# Altium integrated library Library AL.IntLib: 511 symbols (part 2 of 4) (continued)
## L298 (continued)

## L fiter
designator L?, comment L
Inductor; Value: Loc 220; Designed by: VanDungEvn
footprint L fiter (Fiter)
pins: 1, 2, 3, 4

## LCD16x2
designator LCD?, comment LCD16x2A
LCD dipslay 16 char, 2 line; Value: LCD16x2A
footprint LCD16X2N (LCD dipslay 16x2, 16 pin)
footprint LCD16X2 (LCD dipslay 16x2, 16 pin)
pins: 1 GND, 2 VDD, 3 VSS, 4 RS, 5 R/~{W}, 6 ~{EN}, 7 D0, 8 D1, 9 D2, 10 D3, 11 D4, 12 D5, 13 D6, 14 D7, 15 A, 16 K
text: LCD 16*2; -; +

## LCD16x2A
designator LCD?, comment LCD 16x2A
LCD dipslay 16 char, 2 line; Value: LCD16x2A
footprint LCD16X2 (LCD dipslay 16x2, 16 pin)
footprint LCD16X2N (LCD dipslay 16x2, 16 pin)
pins: 1 GND, 2 VDD, 3 VEE, 4 RS, 5 R/~{W}, 6 ~{EN}, 7 D0, 8 D1, 9 D2, 10 D3, 11 D4, 12 D5, 13 D6, 14 D7, 15 A, 16 K
text: 5V; LCD 16*2; Vs; |; 0V; R/W; E

## LCD20x4A
designator LCD, comment LCD 20x4A
LCD dipslay 20 char, 4 line; Value: Jum 40; Value: LCD 20x4A
footprint LCD 20x4A (Footprint not found)
pins: 1 GND, 2 VDD, 3 VSS, 4 RS, 5 R/~{W}, 6 ~{EN}, 7 D0, 8 D1, 9 D2, 10 D3, 11 D4, 12 D5, 13 D6, 14 D7, 15 A, 16 K

## LCD48x84
designator U?, comment PCD8544
LCD Graphic; Value: PCD8544
footprint DIP10 (Footprint not found)
pins: 1 VCC, 2 SCLK, 3 SI, 4 D/C, 5 CS, 6 OSC, 7 GND, 8 Vout, 9 ~{RES}

## LCD128x64
designator LCD?
LCD Graphic 128x64; Value: LCD 128x64
footprint LCD128x64 (LCD Graphic 128x64, 20 pin)
footprint LCD12864 (GLCD)
pins: 1 GND, 2 VDD, 3 VSS, 4 RS, 5 R/~{W}, 6 ~{EN}, 7 D0, 8 D1, 9 D2, 10 D3, 11 D4, 12 D5, 13 D6, 14 D7, 15 S1, 16 S2, 17 ~{RES}, 18 VEE, 19 A, 20 K
text: GLCD 128*64; heromap

## LCD240X128
designator U?
Mµn h×nh LCD 240x128
footprint LCD
pins: 1 FGND, 2 VSS, 3 VDD, 4 V0, 5 ~{WR} (in), 6 ~{RD} (in), 7 ~{CS} (in), 8 C/D (in), 9 ~{RST} (in), 10 DB0 (io), 11 DB1 (io), 12 DB2 (io), 13 DB3 (io), 14 DB4 (io), 15 DB5 (io), 16 DB6 (io), 17 DB7 (io), 18 FS, 19 VEE, 20 LED+, 21 LED-

## LCD240X128_1
designator U?, comment LCD240X128
Mµn h×nh LCD 240x128
footprint LCD
pins: 1 FGND, 2 VSS, 3 VDD, 4 V0, 5 ~{WR} (in), 6 ~{RD} (in), 7 ~{CS} (in), 8 C/D (in), 9 ~{RST} (in), 10 DB0 (io), 11 DB1 (io), 12 DB2 (io), 13 DB3 (io), 14 DB4 (io), 15 DB5 (io), 16 DB6 (io), 17 DB7 (io), 18 FS, 19 VEE, 20 LED+, 21 LED-

## LDR
designator LDR?
Quang Tro
footprint CDS (Footprint not found)
pins: 1 A, 2 K

## LED
designator LED?
LED Single colour Green and Red; Value: LED 3 ly Single Colour
footprint LED-3 (LED 2 PIN, 3ly Only colour)
footprint LED-V (LED 2 PIN, Rectang Only colour)
footprint LED-O (LED 2 PIN,  Ovan Only colour, pin to pin 110mil)
footprint LED-5 GRe (LED 2 PIN, 5 ly , Only colour,pin to pin 100mil)
footprint LED-5TRED (LED 2 PIN, 5 ly , Only colour, pin to pin 110mil)
footprint L-0805 (Compoment SMD 80x50mil)
pins: 1, 2

## LED2
designator LED?, comment LED
LED 2 colour Green and Red; Value: LED 3 - 5 ly 2 Colour
footprint LED-32 (LED 3 PIN, 3ly Two colour)
footprint LED-52 (LED 3 PIN, 5 ly , Two colour)
pins: 1, 2, 3

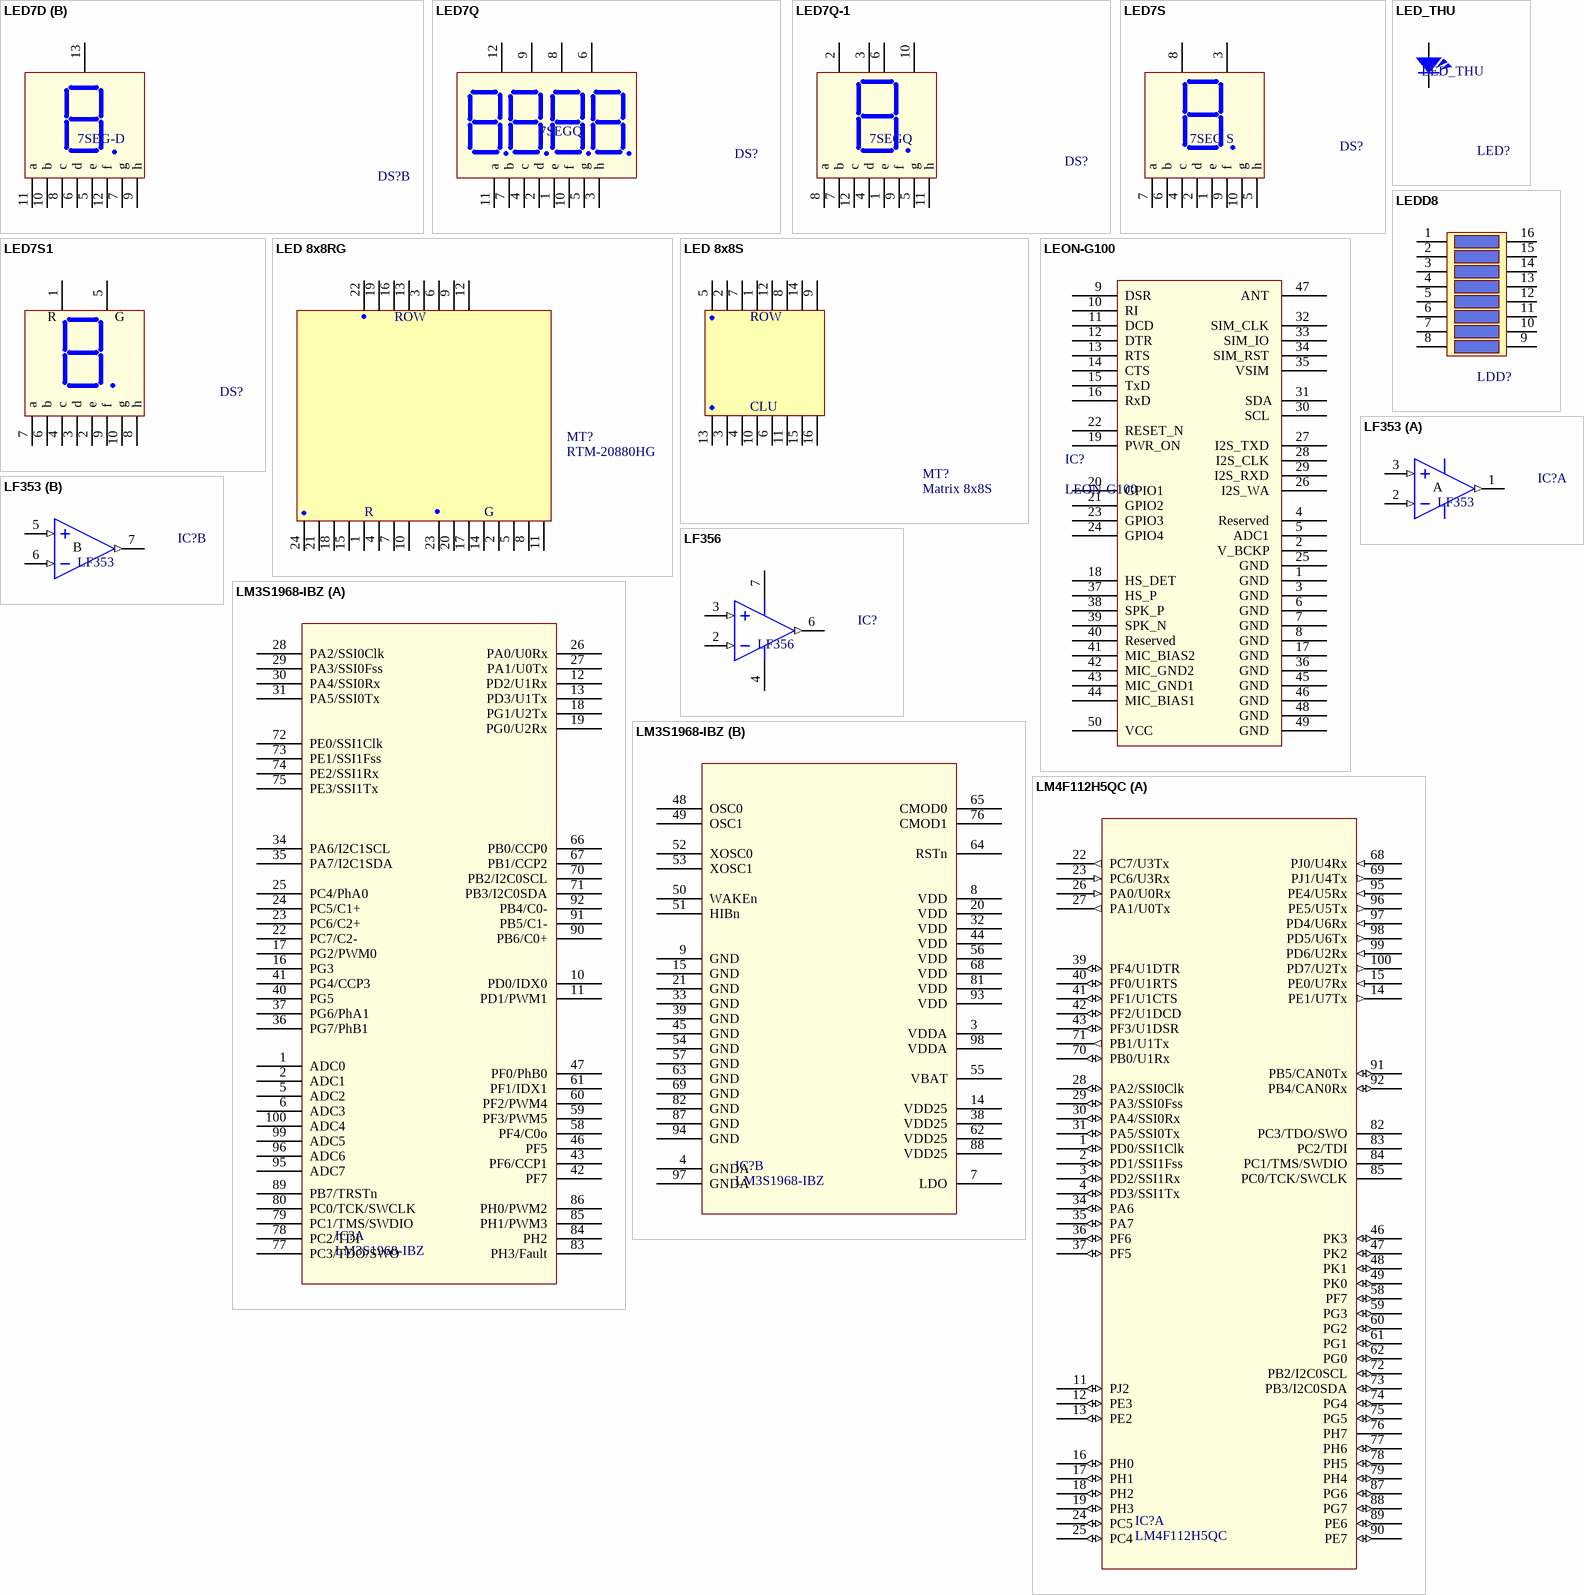
[diagram p12: symbols LED7D to LM4F112H5QC]

## LED7D
designator DS?, comment 7SEG-D
Two 7 Seg Dipslay; Value: LED 7D SEG
footprint 7SEGD (DIP 18Leads; Body 24 x 15 mm; Pitch 0.5 mm)
part A pins: 1 e, 2 d, 3 c, 4 h, 14 V1, 15 b, 16 a, 17 g, 18 f
part B pins: 5 e, 6 d, 7 g, 8 c, 9 h, 10 b, 11 a, 12 f, 13 V2

## LED7Q
designator DS?, comment 7SEGQ
Four 7 Seg Dipslay; Value: LED 7Q SEG
footprint 7SEGQ (DIP 12 Leads; Body 48 x 20 mm; Pitch 0.5 mm)
footprint 7SEGQ-N (DIP 12 Leads; Body 32x 15 mm; Pitch 0.5 mm)
pins: 1 e, 2 d, 3 h, 4 c, 5 g, 6 V4, 7 b, 8 V3, 9 V2, 10 f, 11 a, 12 V1

## LED7Q-1
designator DS?, comment 7SEGQ
Four 7 Seg Dipslay; Value: LED 7Q SEG
footprint 7SEGQ (DIP 12 Leads; Body 48 x 20 mm; Pitch 0.5 mm)
pins: 1 e, 2 V1, 3 V2, 4 d, 5 g, 6 V3, 7 b, 8 a, 9 f, 10 V4, 11 h, 12 c

## LED7S
designator DS?, comment 7SEG S
Single 7 Seg Dipslay; Value: LED 7S SEG
footprint 7SEGS (DIP 10 Leads; Body 12 x 15 mm; Pitch 0.5 mm)
pins: 1 e, 2 d, 3 Vcc, 4 c, 5 h, 6 b, 7 a, 8 Vcc, 9 f, 10 g

## LED7S1
designator DS?, comment 7SEG S  (value not drawn)
Single 7 Seg Dipslay 29x41 mm; Value: LED 7S SEG
footprint 7SEG_29x41 (DIP 10 Leads; Body 29 x 41 mm; Pitch 0.5 mm)
footprint 7SEG_37x55 (DIP 10 Leads; Body 29 x 41 mm; Pitch 0.5 mm)
pins: 1 R, 2 e, 3 d, 4 c, 5 COM, 6 b, 7 a, 8 h, 9 f, 10 g
text: G

## LED 8x8RG
designator MT?, comment RTM-20880HG
Matrix 8x8, Two colour; Value: Matrix 8x8 two colour
footprint 8x8RG (Matran 8x8 2mau,Body 60 X 60mm)
pins: 1 R5, 2 G5, 3 H5, 4 R6, 5 G6, 6 H6, 7 R7, 8 G7, 9 H7, 10 R8, 11 G8, 12 H8, 13 H4, 14 G4, 15 R4, 16 H3, 17 G3, 18 R3, 19 H2, 20 G2, 21 R2, 22 H1, 23 G1, 24 R1
text: ROW; R; G

## LED 8x8S
designator MT?, comment Matrix 8x8S
Matrix 8x8,  Single colour; Value: Matrix 8x8S
footprint 8x8S (Matran 8x8, Body 60 X 60mm)
pins: 1 H4, 2 H2, 3 C2, 4 C3, 5 H1, 6 C5, 7 H3, 8 H6, 9 H8, 10 C4, 11 C6, 12 H5, 13 C1, 14 H7, 15 C7, 16 C8
text: ROW; CLU

## LED_THU
designator LED?
LED Single colour Green and Red; Value: LED 3 ly Single Colour
footprint LED-3 (LED 2 PIN, 3ly Only colour)
footprint LED-V (LED 2 PIN, Rectang Only colour)
footprint LED-O (LED 2 PIN,  Ovan Only colour, pin to pin 110mil)
footprint LED-5 GRe (LED 2 PIN, 5 ly , Only colour,pin to pin 100mil)
footprint LED-5TRED (LED 2 PIN, 5 ly , Only colour, pin to pin 110mil)
pins: 1, 2

## LEDD8
designator LDD?, comment LED DIP 8  (value not drawn)
Value: LED DIP 8
footprint DIP16/W0.3 key (Footprint not found)
pins: 1, 2, 3, 4, 5, 6, 7, 8, 9, 10, 11, 12, 13, 14, 15, 16

## LEON-G100
designator IC?
LEON-G100 quad-band GSM/GPRS
footprint LEON-G100 (LCC, 50-Pins, Body 19,0x30,1mm (max), Pitch 1,10mm, IPC Medium Density)
pins: 1 GND , 2 V_BCKP , 3 GND , 4 Reserved , 5 ADC1 , 6 GND , 7 GND , 8 GND , 9 DSR , 10 RI , 11 DCD , 12 DTR , 13 RTS , 14 CTS , 15 TxD , 16 RxD, 17 GND , 18 HS_DET, 19 PWR_ON , 20 GPIO1 , 21 GPIO2 , 22 RESET_N , 23 GPIO3 , 24 GPIO4 , 25 GND , 26 I2S_WA , 27 I2S_TXD , 28 I2S_CLK , 29 I2S_RXD , 30 SCL , 31 SDA, 32 SIM_CLK , 33 SIM_IO , 34 SIM_RST , 35 VSIM , 36 GND , 37 HS_P , 38 SPK_P , 39 SPK_N , 40 Reserved , 41 MIC_BIAS2 , 42 MIC_GND2 , 43 MIC_GND1, 44 MIC_BIAS1 , 45 GND , 46 GND , 47 ANT , 48 GND , 49 GND , 50 VCC 

## LF353
designator IC?
Wide-Bandwidth Dual JFET Input Operational Amplifier; Published: 15-Apr-2002; LatestRevisionDate: 06-Jun-2005; LatestRevisionNote: Stylized 3D Model Added.; DatasheetDocument: Apr-1998; PackageDocument: Sep-1997; Publisher: Altium Limited; ComponentLink1Description: Manufacturer Link; ComponentLink1URL: http://www.national.com/; ComponentLink2Description: Datasheet; ComponentLink2URL: http://www.national.com/ds.cgi/LF/LF353.pdf; ComponentLink3Description: URL Link1; ComponentLink3URL: http://www.national.com/pf/LF/LF353.html; Value: LF353
footprint DIP8/W0.3 (8 PIN, W 300mil, Pin to pin 100mil)
part A pins: 1 OUT (out), 2 IN- (in), 3 IN+ (in)
part B pins: 5 IN+ (in), 6 IN- (in), 7 OUT (out)
part A text: A
part B text: B

## LF356
designator IC?
Wide-Bandwidth Single JFET Input Operational Amplifier; Published: 15-Apr-2002; LatestRevisionDate: 06-Jun-2005; LatestRevisionNote: Stylized 3D Model Added.; DatasheetDocument: Apr-1998; PackageDocument: Sep-1997; Publisher: Altium Limited; ComponentLink1Description: Manufacturer Link; ComponentLink1URL: http://www.national.com/; ComponentLink2Description: Datasheet; ComponentLink2URL: http://www.national.com/ds.cgi/LF/LF353.pdf; ComponentLink3Description: URL Link1; ComponentLink3URL: http://www.national.com/pf/LF/LF353.html; Value: LF356
footprint DIP8/W0.3 (8 PIN, W 300mil, Pin to pin 100mil)
pins: 2 IN- (in), 3 IN+ (in), 4 V- (power), 6 OUT (out), 7 V+ (power)

## LM3S1968-IBZ
designator IC?
Stellaris ARM Cortex-M3 Microcontroller; Value: LM324
part A pins: 1 ADC0, 2 ADC1, 5 ADC2, 6 ADC3, 10 PD0/IDX0, 11 PD1/PWM1, 12 PD2/U1Rx, 13 PD3/U1Tx, 16 PG3, 17 PG2/PWM0, 18 PG1/U2Tx, 19 PG0/U2Rx, 22 PC7/C2-, 23 PC6/C2+, 24 PC5/C1+, 25 PC4/PhA0, 26 PA0/U0Rx, 27 PA1/U0Tx, 28 PA2/SSI0Clk, 29 PA3/SSI0Fss, 30 PA4/SSI0Rx, 31 PA5/SSI0Tx, 34 PA6/I2C1SCL, 35 PA7/I2C1SDA, 36 PG7/PhB1, 37 PG6/PhA1, 40 PG5, 41 PG4/CCP3, 42 PF7, 43 PF6/CCP1, 46 PF5, 47 PF0/PhB0, 58 PF4/C0o, 59 PF3/PWM5, 60 PF2/PWM4, 61 PF1/IDX1, 66 PB0/CCP0, 67 PB1/CCP2, 70 PB2/I2C0SCL, 71 PB3/I2C0SDA, 72 PE0/SSI1Clk, 73 PE1/SSI1Fss, 74 PE2/SSI1Rx, 75 PE3/SSI1Tx, 77 PC3/TDO/SWO, 78 PC2/TDI, 79 PC1/TMS/SWDIO, 80 PC0/TCK/SWCLK, 83 PH3/Fault, 84 PH2, 85 PH1/PWM3, 86 PH0/PWM2, 89 PB7/TRSTn, 90 PB6/C0+, 91 PB5/C1-, 92 PB4/C0-, 95 ADC7, 96 ADC6, 99 ADC5, 100 ADC4
part B pins: 3 VDDA, 4 GNDA, 7 LDO, 8 VDD, 9 GND, 14 VDD25, 15 GND, 20 VDD, 21 GND, 32 VDD, 33 GND, 38 VDD25, 39 GND, 44 VDD, 45 GND, 48 OSC0, 49 OSC1, 50 WAKEn, 51 HIBn, 52 XOSC0, 53 XOSC1, 54 GND, 55 VBAT, 56 VDD, 57 GND, 62 VDD25, 63 GND, 64 RSTn, 65 CMOD0, 68 VDD, 69 GND, 76 CMOD1, 81 VDD, 82 GND, 87 GND, 88 VDD25, 93 VDD, 94 GND, 97 GNDA, 98 VDDA

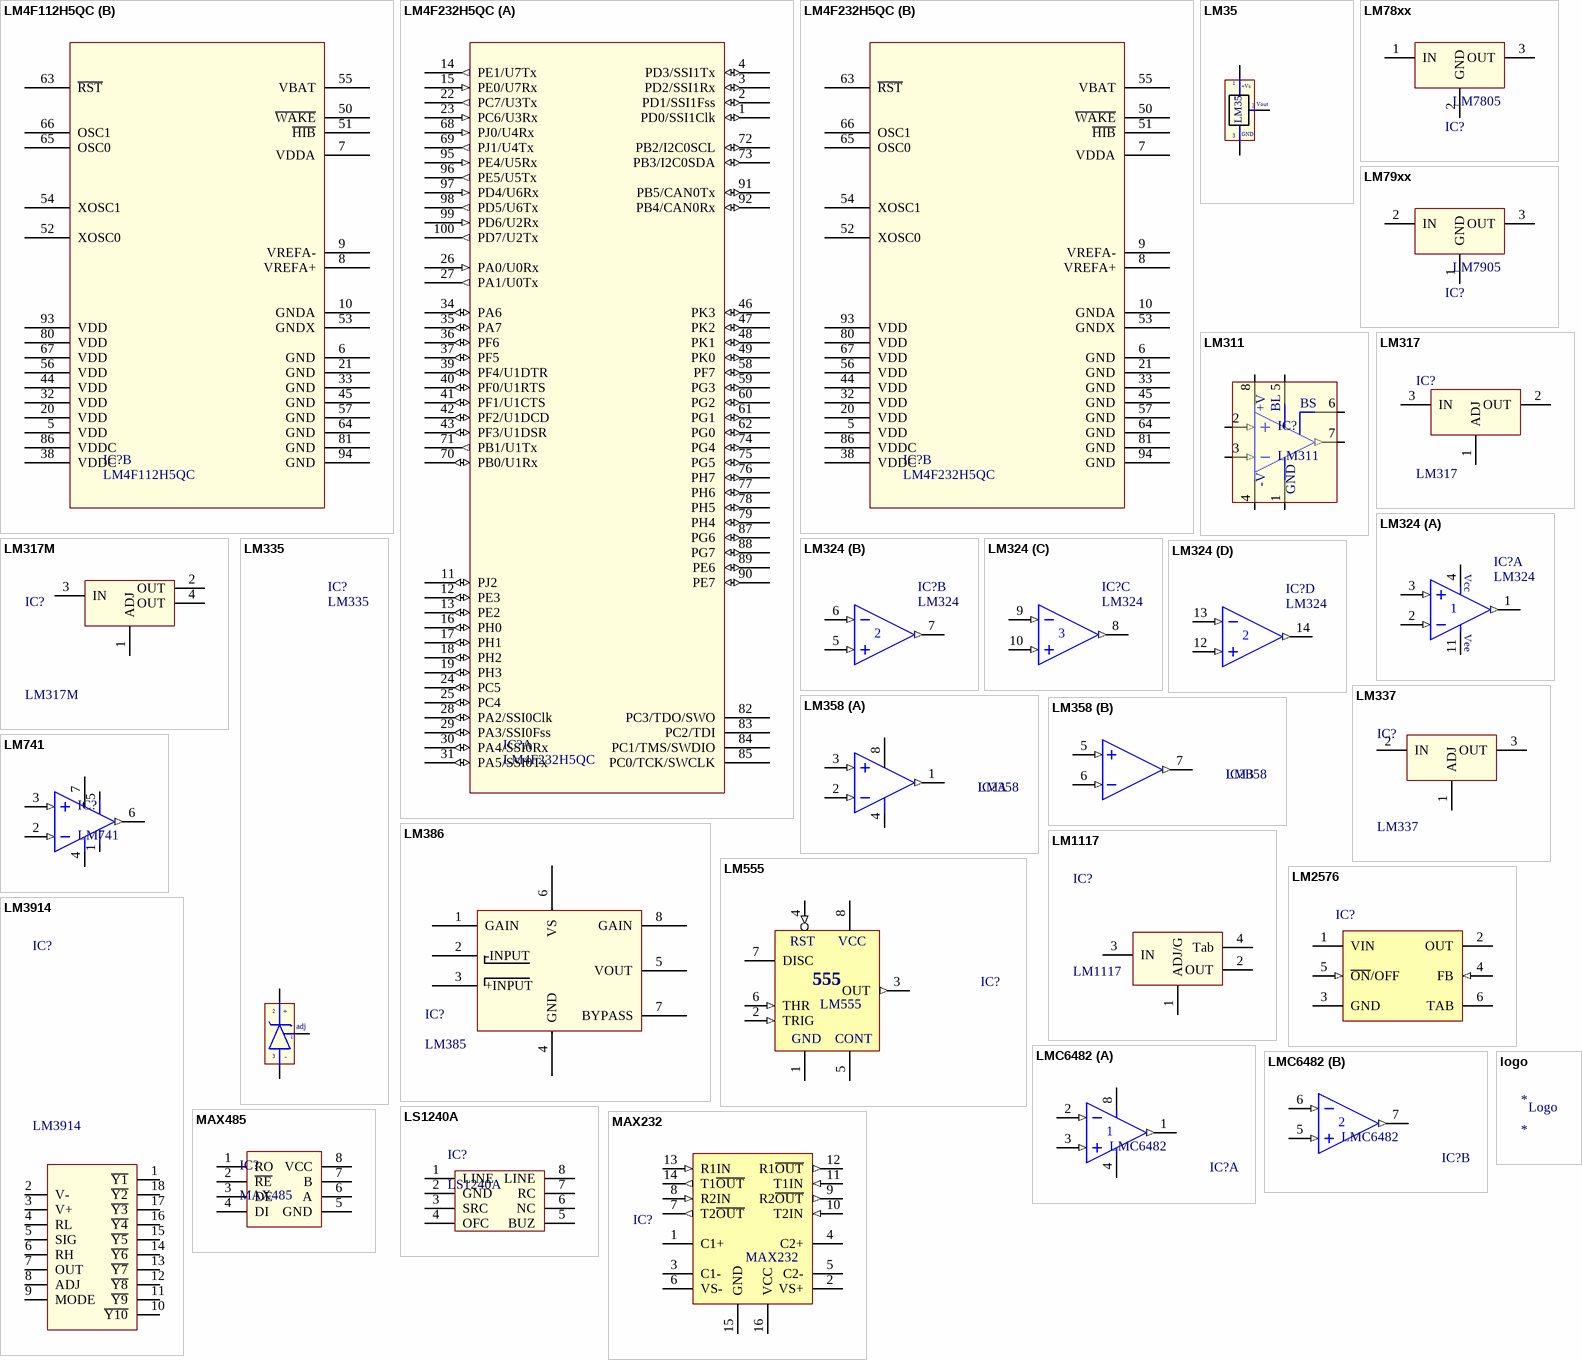
[diagram p13: symbols LM4F112H5QC to MAX485]

## LM4F112H5QC
designator IC?
Stellaris  ® LM4F112H5QC Microcontroller; Value: LM324
part A pins: 1 PD0/SSI1Clk (io), 2 PD1/SSI1Fss (io), 3 PD2/SSI1Rx (io), 4 PD3/SSI1Tx (io), 11 PJ2 (io), 12 PE3 (io), 13 PE2 (io), 14 PE1/U7Tx (out), 15 PE0/U7Rx (in), 16 PH0 (io), 17 PH1 (io), 18 PH2 (io), 19 PH3 (io), 22 PC7/U3Tx (out), 23 PC6/U3Rx (in), 24 PC5 (io), 25 PC4 (io), 26 PA0/U0Rx (in), 27 PA1/U0Tx (out), 28 PA2/SSI0Clk (io), 29 PA3/SSI0Fss (io), 30 PA4/SSI0Rx (io), 31 PA5/SSI0Tx (io), 34 PA6 (io), 35 PA7 (io), 36 PF6 (io), 37 PF5 (io), 39 PF4/U1DTR (io), 40 PF0/U1RTS (io), 41 PF1/U1CTS (io), 42 PF2/U1DCD (io), 43 PF3/U1DSR (io), 46 PK3 (io), 47 PK2 (io), 48 PK1 (io), 49 PK0 (io), 58 PF7 (io), 59 PG3 (io), 60 PG2 (io), 61 PG1 (io), 62 PG0 (io), 68 PJ0/U4Rx (in), 69 PJ1/U4Tx (out), 70 PB0/U1Rx (io), 71 PB1/U1Tx (out), 72 PB2/I2C0SCL (io), 73 PB3/I2C0SDA (io), 74 PG4 (io), 75 PG5 (io), 76 PH7, 77 PH6 (io), 78 PH5 (io), 79 PH4 (io), 82 PC3/TDO/SWO, 83 PC2/TDI, 84 PC1/TMS/SWDIO, 85 PC0/TCK/SWCLK, 87 PG6 (io), 88 PG7 (io), 89 PE6 (io), 90 PE7 (io), 91 PB5/CAN0Tx (io), 92 PB4/CAN0Rx (io), 95 PE4/U5Rx (in), 96 PE5/U5Tx (out), 97 PD4/U6Rx (in), 98 PD5/U6Tx (out), 99 PD6/U2Rx (in), 100 PD7/U2Tx (out)
part B pins: 5 VDD (power), 6 GND (power), 7 VDDA (power), 8 VREFA+ (power), 9 VREFA- (power), 10 GNDA (power), 20 VDD (power), 21 GND (power), 32 VDD (power), 33 GND (power), 38 VDDC (power), 44 VDD (power), 45 GND (power), 50 ~{WAKE}, 51 ~{HIB}, 52 XOSC0, 53 GNDX (power), 54 XOSC1, 55 VBAT (power), 56 VDD (power), 57 GND (power), 63 ~{RST}, 64 GND (power), 65 OSC0, 66 OSC1, 67 VDD (power), 80 VDD (power), 81 GND (power), 86 VDDC (power), 93 VDD (power), 94 GND (power)

## LM4F232H5QC
designator IC?
Stellaris  ® LM4F232H5QC Microcontroller; Value: LM324
footprint QFP50P1600X1600X160-100N (QFP,0.50mm pitch,square;25 pin X 25 pin,14.00mm X 14.00mm X 1.60mm H body)
part A pins: 1 PD0/SSI1Clk (io), 2 PD1/SSI1Fss (io), 3 PD2/SSI1Rx (io), 4 PD3/SSI1Tx (io), 11 PJ2 (io), 12 PE3 (io), 13 PE2 (io), 14 PE1/U7Tx (out), 15 PE0/U7Rx (in), 16 PH0 (io), 17 PH1 (io), 18 PH2 (io), 19 PH3 (io), 22 PC7/U3Tx (out), 23 PC6/U3Rx (in), 24 PC5 (io), 25 PC4 (io), 26 PA0/U0Rx (in), 27 PA1/U0Tx (out), 28 PA2/SSI0Clk (io), 29 PA3/SSI0Fss (io), 30 PA4/SSI0Rx (io), 31 PA5/SSI0Tx (io), 34 PA6 (io), 35 PA7 (io), 36 PF6 (io), 37 PF5 (io), 39 PF4/U1DTR (io), 40 PF0/U1RTS (io), 41 PF1/U1CTS (io), 42 PF2/U1DCD (io), 43 PF3/U1DSR (io), 46 PK3 (io), 47 PK2 (io), 48 PK1 (io), 49 PK0 (io), 58 PF7 (io), 59 PG3 (io), 60 PG2 (io), 61 PG1 (io), 62 PG0 (io), 68 PJ0/U4Rx (in), 69 PJ1/U4Tx (out), 70 PB0/U1Rx (io), 71 PB1/U1Tx (out), 72 PB2/I2C0SCL (io), 73 PB3/I2C0SDA (io), 74 PG4 (io), 75 PG5 (io), 76 PH7 (io), 77 PH6 (io), 78 PH5 (io), 79 PH4 (io), 82 PC3/TDO/SWO, 83 PC2/TDI, 84 PC1/TMS/SWDIO, 85 PC0/TCK/SWCLK, 87 PG6 (io), 88 PG7 (io), 89 PE6 (io), 90 PE7 (io), 91 PB5/CAN0Tx (io), 92 PB4/CAN0Rx (io), 95 PE4/U5Rx (in), 96 PE5/U5Tx (out), 97 PD4/U6Rx (in), 98 PD5/U6Tx (out), 99 PD6/U2Rx (in), 100 PD7/U2Tx (out)
part B pins: 5 VDD (power), 6 GND (power), 7 VDDA (power), 8 VREFA+ (power), 9 VREFA- (power), 10 GNDA (power), 20 VDD (power), 21 GND (power), 32 VDD (power), 33 GND (power), 38 VDDC (power), 44 VDD (power), 45 GND (power), 50 ~{WAKE}, 51 ~{HIB}, 52 XOSC0, 53 GNDX (power), 54 XOSC1, 55 VBAT (power), 56 VDD (power), 57 GND (power), 63 ~{RST}, 64 GND (power), 65 OSC0, 66 OSC1, 67 VDD (power), 80 VDD (power), 81 GND (power), 86 VDDC (power), 93 VDD (power), 94 GND (power)

## LM35
designator U?
Teminal; Value: LM35
footprint QTO-92 (TO-92)
pins: 1 +Vs, 2 Vout, 3 -
text: GND

## LM78xx
designator IC?, comment LM7805
On ap +, from + 5 to + 24VDC; Value: LM7805
footprint QTO-220 (TO-220 - 1-2-3)
footprint QTO-92 (TO-92)
pins: 1 IN, 2 GND, 3 OUT

## LM79xx
designator IC?, comment LM7905
On ap -, from - 5 to - 24VDC; Value: LM7905
footprint QTO-220 (TO-220 - 1-2-3)
pins: 1 GND, 2 IN, 3 OUT

## LM311
designator IC?
Voltage Comparator; Value: DIP 8; Value: LM311
footprint DIP8/W0.3 (8 PIN, W 300mil, Pin to pin 100mil)
footprint SO-8 (8-Pin Small Outline Integrated Circuit 1.27 mm Pitch, IPC Medium Density)
pins: 1 F2 (power), 2 IN+ (in), 3 IN- (in), 4 GND (power), 5 F1 (power), 6 F2 (power), 7 OUT (out), 8 V+ (power)
text: +V; BL; BS; -V

## LM317
designator IC?
Adj Voltage +1.2 -> +37V; Value: LM317
footprint QTO-220 (TO-220 - 1-2-3)
pins: 1 ADJ, 2 OUT, 3 IN

## LM317M
designator IC?
Adj Voltage +1.2 -> +37V; Value: LM317
footprint TO-252 (Footprint not found)
footprint TO229P955X220-4N (KTP D-PAK, 4-Pads, Body 6,3x6,2mm (max), IPC Medium Density)
pins: 1 ADJ, 2 OUT, 3 IN, 4 OUT

## LM324
designator IC?
Op x 4; Value: LM324
footprint DIP14/W0.3 (14PIN, W 300mil, Pin to pin 100mil)
part A pins: 1 OUT (out), 2 IN- (in), 3 IN+ (in), 4 V+ (power), 11 V- (power)
part B pins: 5 IN+ (in), 6 IN- (in), 7 OUT (out)
part C pins: 8 OUT (out), 9 IN- (in), 10 IN+ (in)
part D pins: 12 IN+ (in), 13 IN- (in), 14 OUT (out)
part A text: Vcc; Vee

## LM335
designator IC?
Teminal; Value: LM335
footprint QTO-92 (TO-92)
pins: 1 adj, 2 +, 3 -

## LM337
designator IC?
On ap (-)     -1.2 -> - 37V; Value: LM337
footprint QTO-220 (TO-220 - 1-2-3)
pins: 1 ADJ, 2 IN, 3 OUT

## LM358
designator IC?
Low-Power Dual Operational Amplifier; Value: LM358
footprint DIP8/W0.3 (8 PIN, W 300mil, Pin to pin 100mil)
3D model DIP8 (PCB3D Model)
part A pins: 1 OUT (out), 2 IN- (in), 3 IN+ (in), 4 -V, 8 +V
part B pins: 5 IN+ (in), 6 IN- (in), 7 OUT (out)

## LM386
designator IC?, comment LM385
Low Voltage Audio Power Amplifier
pins: 1 GAIN, 2 -INPUT, 3 +INPUT, 4 GND, 5 VOUT, 6 VS, 7 BYPASS, 8 GAIN

## LM555
designator IC?
Timer; Value: LM555
footprint DIP8/W0.3 (8 PIN, W 300mil, Pin to pin 100mil)
3D model DIP8 (PCB3D Model)
pins: 1 GND (power), 2 TRIG (in), 3 OUT (out), 4 RST (in), 5 CONT, 6 THR (in), 7 DISC (oc), 8 VCC (power)
text: 555

## LM741
designator IC?
Single OA
footprint DIP8/W0.3 (8 PIN, W 300mil, Pin to pin 100mil)
pins: 1 Vos, 2 IN- (in), 3 IN+ (in), 4 -V, 5 Vos, 6 OUT (out), 7 +V

## LM1117
designator IC?
3v3; Value: LM317
footprint SOT223-4N (SOT223, 4-Leads, Body 6.5x3.5mm, Pitch 2.3mm, Lead Span 7mm, IPC Medium Density)
pins: 1 ADJ/G, 2 OUT, 3 IN, 4 Tab